# Altium footprint library connector.PcbLib: 189 footprints (part 6 of 12)
Each footprint in its own frame and in the unit in brackets; x right, y up, seen from the top. Pads: shape width x height; smd on the part's side, far side on the other; paste and mask are expansions set on the pad; w line width, h text height; cw(c..) or ccw(c..) is an arc to the next point about the centre after c.
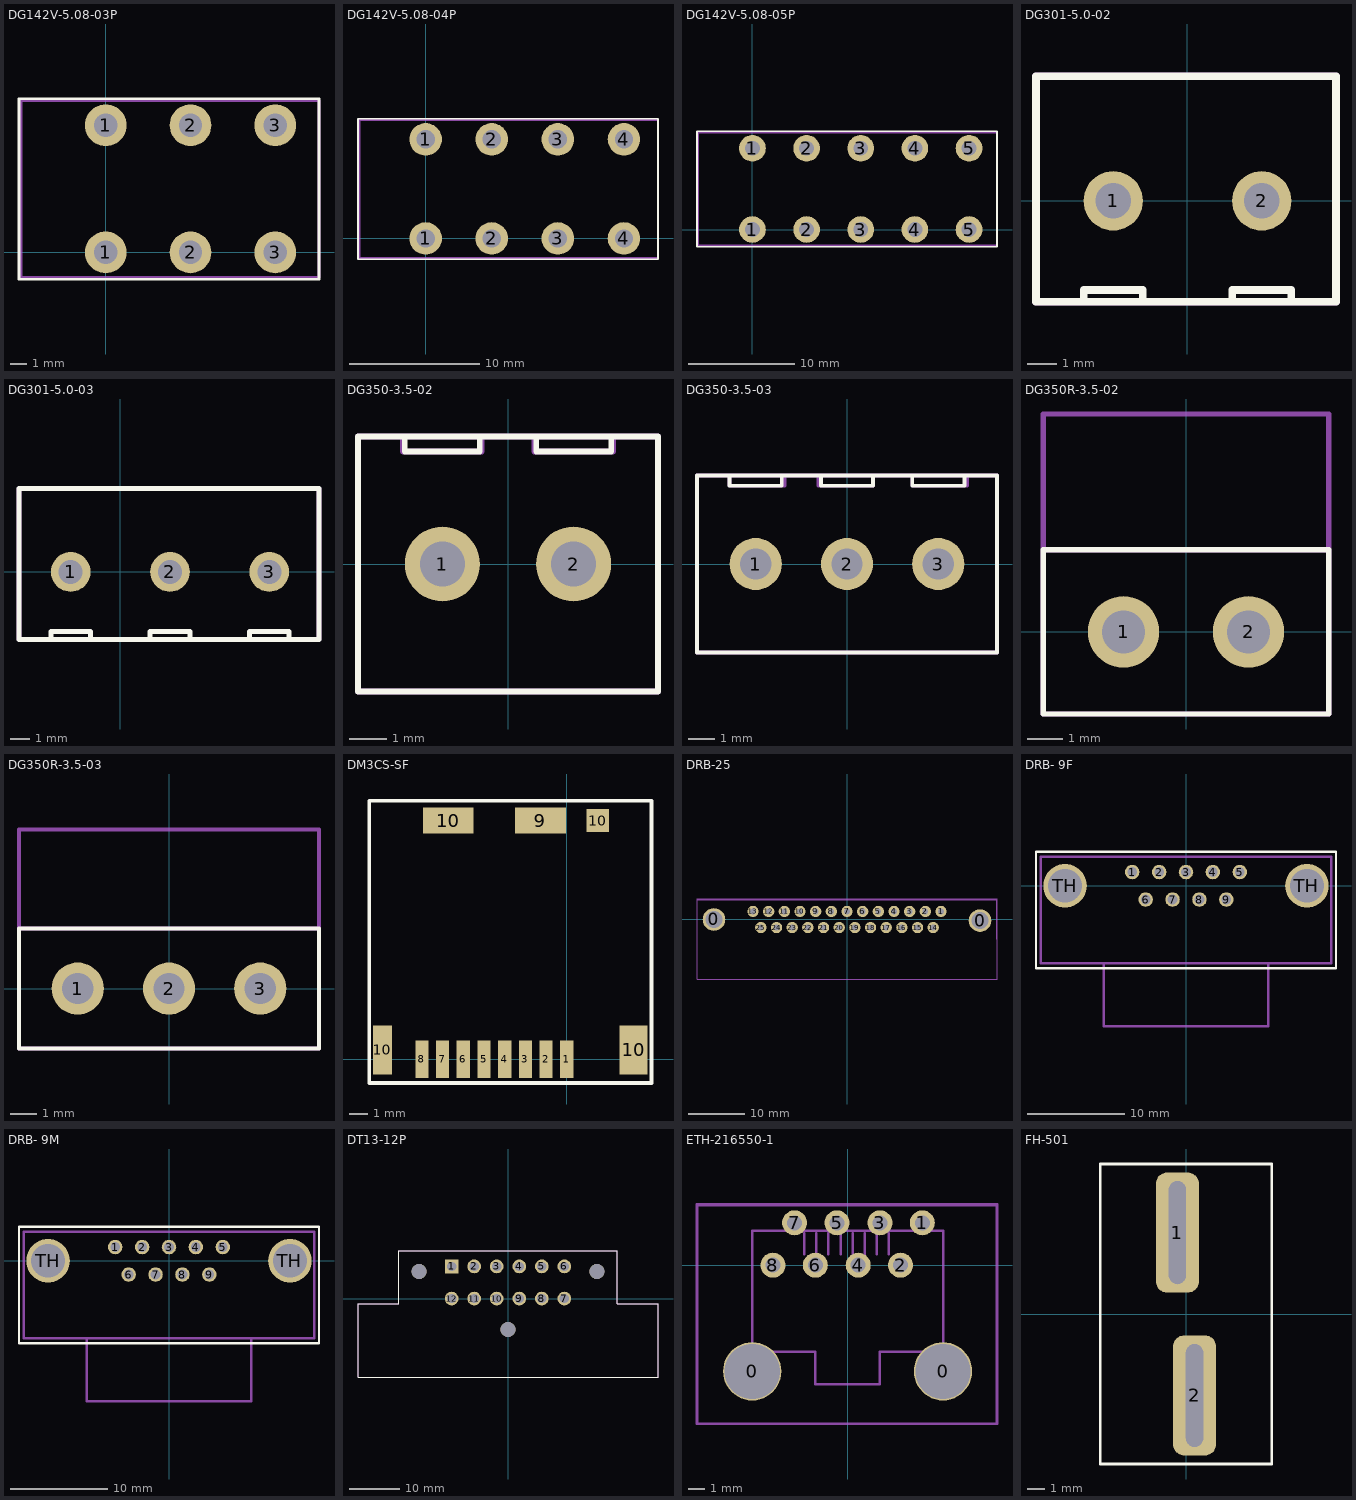
[diagram p5: the footprints below, top view; thin cyan lines are the x and y axes]

## DG142V-5.08-03P [mm]
height 15
pads (6):
  round 2.5 hole 1.4: 1(0,0) 1(0,7.62) 2(5.08,0) 2(5.08,7.62) 3(10.16,0) 3(10.16,7.62)
Top Overlay:
  lines w0.15: -5.2,-1.6 12.78,-1.6 12.78,9.2 -5.2,9.2 -5.2,-1.6
Top Courtyard:
  lines w0.15: -5.08,-1.5 -5.08,9.1 12.78,9.1 12.78,-1.5 -5.08,-1.5
3D body "DG142V-5.08-03P-14-00AH.STEP": height 14.1, standoff -3.5, extent -5.1,-4.1 12.68,9.1

## DG142V-5.08-04P [mm]
height 15
pads (8):
  round 2.5 hole 1.4: 1(0,0) 1(0,7.62) 2(5.08,0) 2(5.08,7.62) 3(10.16,0) 3(10.16,7.62) 4(15.24,0) 4(15.24,7.62)
Top Overlay:
  lines w0.15: -5.2,-1.6 -5.2,9.2 17.86,9.2 17.86,-1.6 -5.2,-1.6
Top Courtyard:
  lines w0.15: -5.08,-1.5 17.86,-1.5 17.86,9.1 -5.08,9.1 -5.08,-1.5
3D body "DG142V-5.08-04P-14-00AH.STEP": height 14.1, standoff -3.5, extent -5.1,-4.1 17.76,9.1

## DG142V-5.08-05P [mm]
height 15
pads (10):
  round 2.5 hole 1.4: 1(0,0) 1(0,7.62) 2(5.08,0) 2(5.08,7.62) 3(10.16,0) 3(10.16,7.62) 4(15.24,0) 4(15.24,7.62) 5(20.32,0) 5(20.32,7.62)
Top Overlay:
  lines w0.15: -5.2,-1.6 22.94,-1.6 22.94,9.2 -5.2,9.2 -5.2,-1.6
Top Courtyard:
  lines w0.15: -5.08,-1.5 -5.08,9.1 22.94,9.1 22.94,-1.5 -5.08,-1.5
3D body "DG142V-5.08-05P-14-00AH.STEP": height 14.1, standoff -3.5, extent -5.1,-4.1 22.84,9.1

## DG301-5.0-02 [mm] "DG301-5.0-02"
height 10
pads (2):
  round 2 hole 1.2: 1(-2.5,0) 2(2.5,0)
Top Overlay:
  lines w0.254: -3.5,-3.4 -3.5,-3 -1.5,-3 -1.5,-3.4 ; 1.5,-3.4 1.5,-3 3.5,-3 3.5,-3.4 ; -5.1,-3.4 -5.1,4.2 5,4.2 5,-3.4 -5.1,-3.4
Top Courtyard:
  lines w0.254: -5.1,-3.4 5,-3.4 5,4.2 -5.1,4.2 -5.1,-3.4
3D body "User Library-DG301-5_0-2P12.STEP": height 10, standoff -4.16, extent -5.6,-3.4 5,4.2

## DG301-5.0-03 [mm] "DG301-5.0-02"
height 10
pads (3):
  round 2 hole 1.2: 1(-2.5,0) 2(2.5,0) 3(7.5,0)
Top Overlay:
  lines w0.254: -3.5,-3.4 -3.5,-3 -1.5,-3 -1.5,-3.4 ; -0.1,-3.4 10,-3.4 10,4.2 -0.1,4.2 ; 5,-3.4 -5.1,-3.4 -5.1,4.2 5,4.2 ; 6.5,-3.4 6.5,-3 8.5,-3 8.5,-3.4 ; 1.5,-3 1.5,-3.4 1.5,-3 ; 1.5,-3 3.5,-3 ; 1.5,-3 3.5,-3 ; 3.5,-3 3.5,-3.4 3.5,-3
Top Courtyard:
  lines w0.254: -0.1,-3.4 10,-3.4 10,4.2 -0.1,4.2 ; 5,-3.4 -5.1,-3.4 -5.1,4.2 5,4.2
3D body "User Library-DG301-5_0-3P12.STEP": height 10, standoff -4.16, extent -5.6,-3.4 10,4.2

## DG350-3.5-02 [mm]
height 10
pads (2):
  round 2 hole 1.2: 1(-1.75,0) 2(1.75,0)
Top Overlay:
  lines w0.15: -2.75,3.4 -2.75,3 -0.75,3 -0.75,3.4 ; 0.75,3.4 0.75,3 2.75,3 2.75,3.4 ; -4,-3.4 -4,3.4 4,3.4 4,-3.4 -4,-3.4
Mechanical 29:
  lines w0.15: -2.8,3.4 -2.8,3 -0.7,3 -0.7,3.4 ; 0.7,3.4 0.7,3 2.8,3 2.8,3.4 ; -4,-3.4 4,-3.4 4,3.4 -4,3.4 -4,-3.4
  text ".Designator" at -3,-0.3 h1
3D body "DG350-3,5-02P.step": height 8.4, standoff -3.4, extent -4,-3.4 4,3.4

## DG350-3.5-03 [mm]
height 10
pads (3):
  round 2 hole 1.2: 1(-3.5,0) 2(0,0) 3(3.5,0)
Top Overlay:
  lines w0.15: -4.5,3.4 -4.5,3 -2.5,3 -2.5,3.4 ; -1,3.4 -1,3 1,3 1,3.4 ; 2.5,3.4 2.5,3 4.5,3 4.5,3.4 ; -5.75,-3.4 5.75,-3.4 5.75,3.4 -5.75,3.4 -5.75,-3.4
Mechanical 29:
  lines w0.15: -4.5,3.4 -4.5,3 -2.4,3 -2.4,3.4 ; -1.1,3.4 -1.1,3 1,3 1,3.4 ; 2.5,3.4 2.5,3 4.6,3 4.6,3.4 ; -5.75,-3.4 -5.75,3.4 5.75,3.4 5.75,-3.4 -5.75,-3.4
  text ".Designator" at -3.5,-0.3 h1
3D body "DG350-3,5-02P.step": height 8.4, standoff -3.4, extent -5.75,-3.4 2.25,3.4
3D body "DG350-3,5-02P.step": height 8.4, standoff -3.4, extent -2.25,-3.4 5.75,3.4

## DG350R-3.5-02 [mm]
height 7
pads (2):
  round 2 hole 1.2: 1(-1.75,0) 2(1.75,0)
Top Overlay:
  lines w0.15: -4,-2.3 4,-2.3 4,2.3 -4,2.3 -4,-2.3
Mechanical 29:
  lines w0.15: -4,2.3 4,2.3 ; -4,-2.3 4,-2.3 4,6.1 -4,6.1 -4,-2.3
  text ".Designator" at -3,-0.3 h1

## DG350R-3.5-03 [mm]
height 7
pads (3):
  round 2 hole 1.2: 1(-3.5,0) 2(0,0) 3(3.5,0)
Top Overlay:
  lines w0.15: -5.75,-2.3 -5.75,2.3 5.75,2.3 5.75,-2.3 -5.75,-2.3
Mechanical 29:
  lines w0.15: -5.75,2.3 5.75,2.3 ; -5.75,-2.3 -5.75,6.1 5.75,6.1 5.75,-2.3 -5.75,-2.3
  text ".Designator" at -3.5,-0.3 h1

## DM3CS-SF [mm] "Hirose,  10 (8 + 2) Position Card Connector Secure Digital - microSD� Surface Mount, Right Angle Gold"
height 1.83
pads (13):
  rect 0.7x2 smd: 1(0,0) 2(-1.1,0) 3(-2.2,0) 4(-3.3,0) 5(-4.4,0) 6(-5.5,0) 7(-6.6,0) 8(-7.7,0)
  rect 2.7x1.4 smd: 9(-1.4,12.7) 10(-6.3,12.7)
  rect 1x2.6 smd: 10(-9.8,0.5)
  rect 1.2x1.2 smd: 10(1.65,12.7)
  rect 1.5x2.6 smd: 10(3.55,0.5)
Top Overlay:
  lines w0.2: -10.5,-1.25 -10.5,13.75 4.5,13.75 4.5,-1.25 -10.5,-1.25
3D body "DM3CS-SF.stp": height 1.93, standoff 0, extent -9.9,-0.727 3.9,13.373

## DRB-25 [mm]
height 12.5
pads (27):
  round 4 hole 3: 0(-23.52,0) 0(23.52,-0.2)
  round 2 hole 1: 1(16.62,1.42) 2(13.85,1.42) 3(11.08,1.42) 4(8.31,1.42) 5(5.54,1.42) 6(2.77,1.42) 7(0,1.42) 8(-2.77,1.42) 9(-5.54,1.42) 10(-8.31,1.42) 11(-11.08,1.42) 12(-13.85,1.42) 13(-16.62,1.42) 14(15.24,-1.42) 15(12.47,-1.42) 16(9.7,-1.42) 17(6.93,-1.42) 18(4.16,-1.42) 19(1.39,-1.42) 20(-1.38,-1.42) 21(-4.15,-1.42) 22(-6.92,-1.42) 23(-9.69,-1.42) 24(-12.46,-1.42) 25(-15.23,-1.42)
Mechanical 29:
  lines w0.15: -26.5,-3.5 -26.5,3.5 26.5,3.5 26.5,-3.5 ; -26.52,-10.6 -26.52,3.7 26.52,3.7 26.52,-10.6 -26.52,-10.6
  text ".Designator" at -3.5,-3.8 h1
3D body "DB-25S-1A5N-A191-A197.STEP": height 13.77, standoff -3.48, extent -26.55,-17.13 26.55,3.4

## DRB- 9F [mm]
height 12.5
pads (11):
  round 1.5 hole 1: 1(-5.56,1.42) 2(-2.78,1.42) 3(0,1.42) 4(2.78,1.42) 5(5.56,1.42) 6(-4.17,-1.42) 7(-1.39,-1.42) 8(1.39,-1.42) 9(4.17,-1.42)
  round 4.5 hole 3.5: TH(-12.5,0) TH(12.5,0)
Top Overlay:
  lines w0.254: -15.5,-8.5 15.5,-8.5 15.5,3.5 -15.5,3.5 -15.5,-8.5
Mechanical 29:
  lines w0.254: -8.5,-8 -8.5,-14.5 8.5,-14.5 8.5,-8 ; -15,-8 15,-8 15,3 -15,3 -15,-8
  text ".Designator" at -6,-6 h1.52
3D body "DB-9F.step": height 12.75, standoff -3.65, extent -15.25,-13.5 15.25,3.2

## DRB- 9M [mm]
height 12.5
pads (11):
  round 1.5 hole 1: 1(-5.56,1.42) 2(-2.78,1.42) 3(0,1.42) 4(2.78,1.42) 5(5.56,1.42) 6(-4.17,-1.42) 7(-1.39,-1.42) 8(1.39,-1.42) 9(4.17,-1.42)
  round 4.5 hole 3.5: TH(-12.5,0) TH(12.5,0)
Top Overlay:
  lines w0.254: -15.5,-8.5 -15.5,3.5 15.5,3.5 15.5,-8.5 -15.5,-8.5
Mechanical 29:
  lines w0.254: -8.5,-8 -8.5,-14.5 8.5,-14.5 8.5,-8 ; -15,-8 -15,3 15,3 15,-8 -15,-8
  text ".Designator" at -6,-6 h1.52
3D body "DRB-9MB.STEP": height 12.6, standoff -3.2, extent -15.4,-16.4 15.4,3.4

## DT13-12P [mm]
pads (15):
  rect 2.715x2.715 hole 1.81: 1(-11.115,6.35)
  round 2.715 hole 1.81: 2(-6.67,6.35) 3(-2.225,6.35) 4(2.225,6.35) 5(6.67,6.35) 6(11.115,6.35) 7(11.115,0) 8(6.67,0) 9(2.225,0) 10(-2.225,0) 11(-6.67,0) 12(-11.115,0)
  round 2.99 hole 2.99 unplated: ""(-17.54,5.34) ""(0,-6.1) ""(17.54,5.34)
Top Overlay:
  lines w0.15: -29.605,-15.49 -20.28,-15.49 20.28,-15.49 29.605,-15.49 29.605,-1 21.605,-1 21.605,9.4 -21.605,9.4 -21.605,-1 -29.605,-1 -29.605,-15.49
  text "." at -11.521,10.029 h0.1
Top Courtyard:
  lines w0.127: -29.605,-15.49 -20.28,-15.49 20.28,-15.49 29.605,-15.49 29.605,-1 21.605,-1 21.605,9.4 -21.605,9.4 -21.605,-1 -29.605,-1 -29.605,-15.49
3D body "c-dt13-12pb-d-3d.stp": height 33.65, standoff -4.98, extent -29.577,-30.312 29.605,9.312

## ETH-216550-1 [mm]
pads (10):
  round 3.5 hole 3.3: 0(-5.715,-6.36) 0(5.715,-6.36)
  round 1.5 hole 0.9: 1(4.475,2.54) 2(3.175,0) 3(1.935,2.54) 4(0.635,0) 5(-0.635,2.54) 6(-1.935,0) 7(-3.175,2.54) 8(-4.475,0)
Mechanical 29:
  lines w0.15: -2.6,0.65 -2.6,1.925 ; -1.875,0.65 -1.875,1.925 ; -1.15,0.65 -1.15,1.925 ; -0.425,0.65 -0.425,1.925 ; 0.3,0.65 0.3,1.925 ; 1.025,0.65 1.025,1.925 ; 1.75,0.65 1.75,1.925 ; 2.475,0.65 2.475,1.925 ; -9.025,-9.5 -9.025,3.65 8.95,3.65 8.95,-9.5 ; -9.025,-9.5 8.95,-9.5 ; -9.025,-9.5 -9.025,3.6 8.95,3.6 8.95,-9.5 ; -9.025,-9.5 8.95,-9.5 ; -5.715,-5.2 -5.715,2.05 5.715,2.05 5.715,-5.2 1.935,-5.2 1.935,-7.125 -1.935,-7.125 -1.935,-5.2 -5.715,-5.2
  text ".Designator" at -3.5,-2.8 h1
3D body "c-216550-1.STEP": height 16.5, standoff -3.1, extent -9.05,-9.625 8.95,3.075

## FH-501 [mm]
pads (2):
  rrect50% 2.5x7 hole 6 slot 1 at 0 deg: 1(-0.5,4.75) 2(0.5,-4.75)
Top Overlay:
  lines w0.15: -5,-8.75 5,-8.75 5,8.75 -5,8.75 -5,-8.75
3D body "FH-501.stp": height 15, standoff -7, extent -5,-18.5 5,19